# Altium footprint library PcbLib_ICs.PcbLib: 317 footprints (part 8 of 24) (continued)
## KT-28A-2.02 [mm]
pads (5):
  oval 2x4 hole 1.3 mask+0.075: 1(-2.54,-16.9) 2(0,-16.9) 3(2.54,-16.9)
  round 0 hole 4.2 unplated: 2(-0.001,4.35)
  rrect20% 11.8x15.15 smd paste-10 mask+0.05: 2(0,0.05)
Top Overlay:
  region: -4.1,-16.9 -5.4,-16.2 -5.4,-17.6
  lines w0.2: -5.6,-7.6 -5.6,-12.1 ccw(c-5.4,-12.1) -5.4,-12.3 5.4,-12.3 ccw(c5.4,-12.1) 5.6,-12.1 5.6,-7.6 ; -2.84,-12.3 -2.84,-14.5 -2.24,-14.5 -2.24,-12.3 ; -0.3,-12.3 -0.3,-14.5 0.3,-14.5 0.3,-12.3 ; 2.24,-12.3 2.24,-14.5 2.84,-14.5 2.84,-12.3
Top Paste:
  region: 1.25,1.25 0.25,1.25 0.25,0.25 1.25,0.25
  region: 1.25,-0.25 0.25,-0.25 0.25,-1.25 1.25,-1.25
  region: 2.75,-0.25 1.75,-0.25 1.75,-1.25 2.75,-1.25
  region: 2.75,1.25 1.75,1.25 1.75,0.25 2.75,0.25
  region: 4.25,-0.25 3.25,-0.25 3.25,-1.25 4.25,-1.25
  region: 4.25,1.25 3.25,1.25 3.25,0.25 4.25,0.25
  region: 5.75,-0.25 4.75,-0.25 4.75,-1.25 5.75,-1.25
  region: 5.75,1.25 4.75,1.25 4.75,0.25 5.75,0.25
  region: 5.75,-1.75 4.75,-1.75 4.75,-2.75 5.75,-2.75
  region: 4.25,-1.75 3.25,-1.75 3.25,-2.75 4.25,-2.75
  region: 2.75,-1.75 1.75,-1.75 1.75,-2.75 2.75,-2.75
  region: 1.25,-1.75 0.25,-1.75 0.25,-2.75 1.25,-2.75
  region: 5.75,-3.25 4.75,-3.25 4.75,-4.25 5.75,-4.25
  region: 4.25,-3.25 3.25,-3.25 3.25,-4.25 4.25,-4.25
  region: 2.75,-3.25 1.75,-3.25 1.75,-4.25 2.75,-4.25
  region: 1.25,-3.25 0.25,-3.25 0.25,-4.25 1.25,-4.25
  region: 2.75,2.75 1.75,2.75 1.75,1.75 2.75,1.75
  region: 4.25,2.75 3.25,2.75 3.25,1.75 4.25,1.75
  region: 5.75,2.75 4.75,2.75 4.75,1.75 5.75,1.75
  region: 5.75,4.25 4.75,4.25 4.75,3.25 5.75,3.25
  region: 4.25,4.25 3.25,4.25 3.25,3.25 4.25,3.25
  rectangle: -4.25,3.25 -3.25,4.25
  rectangle: -5.75,3.25 -4.75,4.25
  rectangle: -5.75,1.75 -4.75,2.75
  rectangle: -4.25,1.75 -3.25,2.75
  rectangle: -2.75,1.75 -1.75,2.75
  rectangle: -1.25,-4.25 -0.25,-3.25
  rectangle: -2.75,-4.25 -1.75,-3.25
  rectangle: -4.25,-4.25 -3.25,-3.25
  rectangle: -5.75,-4.25 -4.75,-3.25
  rectangle: -1.25,-2.75 -0.25,-1.75
  rectangle: -2.75,-2.75 -1.75,-1.75
  rectangle: -4.25,-2.75 -3.25,-1.75
  rectangle: -5.75,-2.75 -4.75,-1.75
  rectangle: -5.75,0.25 -4.75,1.25
  rectangle: -5.75,-1.25 -4.75,-0.25
  rectangle: -4.25,0.25 -3.25,1.25
  rectangle: -4.25,-1.25 -3.25,-0.25
  rectangle: -2.75,0.25 -1.75,1.25
  rectangle: -2.75,-1.25 -1.75,-0.25
  rectangle: -1.25,-1.25 -0.25,-0.25
  rectangle: -1.25,0.25 -0.25,1.25
  rectangle: -4.25,4.75 -3.25,5.75
  rectangle: -5.75,4.75 -4.75,5.75
  rectangle: -4.25,6.25 -3.25,7.25
  rectangle: -2.75,6.25 -1.75,7.25
  region: 2.75,7.25 1.75,7.25 1.75,6.25 2.75,6.25
  region: 4.25,7.25 3.25,7.25 3.25,6.25 4.25,6.25
  region: 5.75,5.75 4.75,5.75 4.75,4.75 5.75,4.75
  region: 4.25,5.75 3.25,5.75 3.25,4.75 4.25,4.75
  rectangle: -5.75,-5.75 -4.75,-4.75
  rectangle: -4.25,-5.75 -3.25,-4.75
  rectangle: -2.75,-5.75 -1.75,-4.75
  rectangle: -1.25,-5.75 -0.25,-4.75
  rectangle: -4.25,-7.25 -3.25,-6.25
  rectangle: -2.75,-7.25 -1.75,-6.25
  rectangle: -1.25,-7.25 -0.25,-6.25
  region: 1.25,-6.25 0.25,-6.25 0.25,-7.25 1.25,-7.25
  region: 2.75,-6.25 1.75,-6.25 1.75,-7.25 2.75,-7.25
  region: 4.25,-6.25 3.25,-6.25 3.25,-7.25 4.25,-7.25
  region: 1.25,-4.75 0.25,-4.75 0.25,-5.75 1.25,-5.75
  region: 2.75,-4.75 1.75,-4.75 1.75,-5.75 2.75,-5.75
  region: 4.25,-4.75 3.25,-4.75 3.25,-5.75 4.25,-5.75
  region: 5.75,-4.75 4.75,-4.75 4.75,-5.75 5.75,-5.75
Top Assy:
  circle w0.05: c-0.001,4.35 r1.8
  lines w0.05: -3.291,-11.95 -3.291,-12.8 -2.966,-12.8 -2.966,-15.725 ; -1.791,-11.95 -1.791,-12.8 -2.116,-12.8 -2.116,-15.725 ; -0.426,-11.95 -0.426,-15.725 ; 0.424,-11.95 0.424,-15.725 ; 1.789,-11.95 1.789,-12.8 2.114,-12.8 2.114,-15.725 ; 3.289,-11.95 3.289,-12.8 2.964,-12.8 2.964,-15.725 ; 5.399,-7.15 5.4,-7.15 5.4,1.15 5.399,1.15 ; -5.402,-7.15 -5.401,-7.15 ; -5.402,-7.15 -5.402,1.15 ; -5.402,1.15 -5.401,1.15 ; -5.401,1.15 -5.401,6.15 cw(c-4.401,6.15) -4.401,7.15 4.399,7.15 cw(c4.399,6.15) 5.399,6.15 5.399,1.15 ; -5.401,1.15 -5.401,-11.95 5.399,-11.95 5.399,1.15 ; -5.401,1.15 5.399,1.15 ; -5.301,-11.3 ccw(c-4.801,-11.3) -4.801,-11.8 ; -5.301,-11.3 -5.301,0.5 ; -5.301,-11.3 -5.211,-11.3 ; -5.301,0.5 cw(c-4.801,0.5) -4.801,1 ; -5.301,0.5 -5.211,0.5 ; -5.211,-11.3 ccw(c-4.801,-11.3) -4.801,-11.71 ; -5.211,-11.3 -5.211,0.5 ; -5.211,0.5 cw(c-4.801,0.5) -4.801,0.911 ; -4.801,-11.8 -4.801,-11.71 ; -4.801,-11.8 4.799,-11.8 ; -4.801,-11.71 4.799,-11.71 ; -4.801,0.911 4.799,0.911 ; -4.801,0.911 -4.801,1 ; -4.801,1 4.799,1 ; -4.001,-9.5 ccw(c-3.501,-9.5) -3.501,-10 ; -4.001,-9.5 -4.001,-1 ; -4.001,-9.5 -3.871,-9.5 ; -4.001,-1 cw(c-3.501,-1) -3.501,-0.5 ; -4.001,-1 -3.871,-1 ; -3.871,-9.5 ccw(c-3.501,-9.5) -3.501,-9.87 ; -3.871,-9.5 -3.871,-1 ; -3.871,-1 cw(c-3.501,-1) -3.501,-0.63 ; -3.501,-10 -3.501,-9.87 ; -3.501,-10 3.499,-10 ; -3.501,-9.87 3.499,-9.87 ; -3.501,-0.63 -3.501,-0.5 ; -3.501,-0.63 3.499,-0.63 ; -3.501,-0.5 3.499,-0.5 ; -2.966,-15.725 -2.966,-17.225 -2.116,-17.225 -2.116,-15.725 ; -2.966,-15.725 -2.116,-15.725 ; -0.426,-15.725 -0.426,-17.225 0.424,-17.225 0.424,-15.725 ; -0.426,-15.725 0.424,-15.725 ; 2.114,-15.725 2.114,-17.225 2.964,-17.225 2.964,-15.725 ; 2.114,-15.725 2.964,-15.725 ; 3.499,-10 ccw(c3.499,-9.5) 3.999,-9.5 ; 3.499,-10 3.499,-9.87 ; 3.499,-9.87 ccw(c3.499,-9.5) 3.869,-9.5 ; 3.499,-0.63 cw(c3.499,-1) 3.869,-1 ; 3.499,-0.63 3.499,-0.5 ; 3.499,-0.5 cw(c3.499,-1) 3.999,-1 ; 3.869,-9.5 3.999,-9.5 ; 3.869,-9.5 3.869,-1 ; 3.869,-1 3.999,-1 ; 3.999,-9.5 3.999,-1 ; 4.799,-11.8 ccw(c4.799,-11.3) 5.299,-11.3 ; 4.799,-11.8 4.799,-11.71 ; 4.799,-11.71 ccw(c4.799,-11.3) 5.21,-11.3 ; 4.799,0.911 cw(c4.799,0.5) 5.21,0.5 ; 4.799,0.911 4.799,1 ; 4.799,1 cw(c4.799,0.5) 5.299,0.5 ; 5.21,-11.3 5.21,0.5 ; 5.21,-11.3 5.299,-11.3 ; 5.21,0.5 5.299,0.5 ; 5.299,-11.3 5.299,0.5
  text ".Designator" at -3.443,-6.967 h2
Top Text:
  lines w0.1: -0.5,-6 0.5,-6 ; 0,-6.5 0,-5.5
3D body "KT-28A-2_02-1.x_t": height 4.4, standoff -4.75, extent -5.401,-17.225 5.401,7.15

## KT-46 [mm]
height 1.45
pads (3):
  rect 1.1x0.6 smd paste+0 mask+0.05: 1(-1.2,0.95)
  oval 1.1x0.6 smd paste+0 mask+0.05: 2(-1.2,-0.95) 3(1.2,0)
Top Overlay:
  circle w0.25: c-1.575,1.75 r0.125
  lines w0.2: -1,-1.5 -1,-1.625 1,-1.625 1,-1.5 ; -1,1.525 -1,1.65 1,1.65 1,1.525
Top Assy:
  circle w0.05: c-0.26,1.06 r0.169
  lines w0.05: -1.19,-1.19 -1.19,-0.71 ; -1.19,-1.19 -1.4,-1.19 -1.4,-0.71 -1.19,-0.71 ; -1.19,-1.19 -1.099,-1.19 ; -1.19,-0.71 -1.099,-0.71 ; -1.19,0.71 -1.19,1.19 ; -1.19,0.71 -1.4,0.71 -1.4,1.19 -1.19,1.19 ; -1.19,0.71 -1.099,0.71 ; -1.19,1.19 -1.099,1.19 ; -1.099,-1.19 -1.099,-0.71 ; -1.099,-1.19 -1.074,-1.19 ; -1.099,-0.71 -1.074,-0.71 ; -1.099,0.71 -1.099,1.19 ; -1.099,0.71 -1.074,0.71 ; -1.099,1.19 -1.074,1.19 ; -1.074,-1.19 -1.074,-0.71 ; -1.074,-1.19 -0.825,-1.19 ; -1.074,-0.71 -0.825,-0.71 ; -1.074,0.71 -1.074,1.19 ; -1.074,0.71 -0.825,0.71 ; -1.074,1.19 -0.825,1.19 ; -0.825,-1.19 -0.825,-0.71 ; -0.825,-1.19 -0.65,-1.19 ; -0.825,-0.71 -0.65,-0.71 ; -0.825,0.71 -0.825,1.19 ; -0.825,0.71 -0.65,0.71 ; -0.825,1.19 -0.65,1.19 ; -0.65,-1.45 0.65,-1.45 ; -0.65,-1.45 -0.65,-1.19 ; -0.65,-1.45 -0.576,-1.376 ; -0.65,-1.19 -0.65,-0.71 ; -0.65,-0.71 -0.65,0.71 ; -0.65,0.71 -0.65,1.19 ; -0.65,1.19 -0.65,1.45 ; -0.65,1.45 -0.576,1.376 ; -0.65,1.45 0.65,1.45 ; -0.576,-1.376 0.576,-1.376 ; -0.576,-1.376 -0.576,1.376 ; -0.576,1.376 0.576,1.376 ; 0.576,-1.376 0.65,-1.45 ; 0.576,-1.376 0.576,1.376 ; 0.576,1.376 0.65,1.45 ; 0.65,-1.45 0.65,-0.24 ; 0.65,-0.24 0.825,-0.24 ; 0.65,-0.24 0.65,0.24 ; 0.65,0.24 0.825,0.24 ; 0.65,0.24 0.65,1.45 ; 0.825,-0.24 0.825,0.24 ; 0.825,-0.24 1.074,-0.24 ; 0.825,0.24 1.074,0.24 ; 1.074,-0.24 1.074,0.24 ; 1.074,-0.24 1.099,-0.24 ; 1.074,0.24 1.099,0.24 ; 1.099,-0.24 1.099,0.24 ; 1.099,-0.24 1.19,-0.24 ; 1.099,0.24 1.19,0.24 ; 1.19,-0.24 1.19,0.24 ; 1.19,-0.24 1.4,-0.24 1.4,0.24 1.19,0.24
  text ".Designator" at 0.233,-1.719 h1
Top Text:
  lines w0.05: -2,-1.75 2,-1.75 2,1.75 -2,1.75 -2,-1.75
  lines w0.1: -0.5,0 0.5,0 ; 0,-0.5 0,0.5
3D body "SOT23-3.stp": height 1, standoff 0, extent -1.15,-1.45 1.15,1.45

## KT-93-1 [mm]
pads (3):
  rect 8x6.5 smd paste-10 mask+0.05: 1(0,0)
  rect 3x3.5 smd paste-10 mask+0.05: 2(2,-5.75) 3(-2,-5.75)
Top Overlay:
  lines w0.2: -4,-3.5 -4,-7.75 4,-7.75 4,-3.5 ; -4,3.5 4,3.5
Top Paste:
  drawing of 162 lines, arcs and shapes, not listed
Top Assy:
  lines w0.05: -3.736,-7.122 3.75,-7.122 3.75,2.925 -3.736,2.925 -3.736,-7.122 ; -3.441,-6.629 ccw(c-3.244,-6.629) -3.244,-6.826 3.257,-6.826 ccw(c3.257,-6.629) 3.454,-6.629 3.454,2.432 ccw(c3.257,2.432) 3.257,2.629 -3.244,2.629 ccw(c-3.244,2.432) -3.441,2.432 -3.441,-6.629 ; -2.751,-5.94 ccw(c-2.554,-5.94) -2.554,-6.137 2.568,-6.137 ccw(c2.568,-5.94) 2.765,-5.94 2.765,1.743 ccw(c2.568,1.743) 2.568,1.94 -2.554,1.94 ccw(c-2.554,1.743) -2.751,1.743 -2.751,-5.94 ; -2.603,-5.842 ccw(c-2.455,-5.841) -2.455,-5.989 2.469,-5.989 ccw(c2.469,-5.841) 2.617,-5.841 2.617,1.645 ccw(c2.469,1.645) 2.469,1.792 -2.455,1.792 ccw(c-2.455,1.644) -2.603,1.644 -2.603,-5.841
  text ".Designator" at -3.443,-2.967 h2
3D body "KT-93-1_PINK.x_t": height 2.98, standoff -0.02, extent -3.75,-7.3 3.75,2.8

## LBGA-24 [mm] "LBGA-24 package with 1mm pitch for EPCQL1024F24IN device"
height 1.3
pads (24):
  round 0.35 smd paste+0 mask+0.08: A2(-1,2) A3(0,2) A4(1,2) A5(2,2) B1(-2,1) B2(-1,1) B3(0,1) B4(1,1) B5(2,1) C1(-2,0) C2(-1,0) C3(0,0) C4(1,0) C5(2,0) D1(-2,-1) D2(-1,-1) D3(0,-1) D4(1,-1) D5(2,-1) E1(-2,-2) E2(-1,-2) E3(0,-2) E4(1,-2) E5(2,-2)
Top Overlay:
  circle w0.25: c-3.65,3.85 r0.125
  region: -2,4 -3,3 -3,4
  lines w0.2: -3,3 -2,4 ; -3,-4 -3,4 3,4 3,-4 -3,-4
Top Assy:
  circle w0.05: c-2,3 r0.15
  lines w0.05: -3,-4 -3,4 3,4 3,-4 -3,-4
  text ".Designator" at -3.443,-0.467 h2
Top Text:
  lines w0.05: -3.25,-4.25 -3.25,4.25 3.25,4.25 3.25,-4.25 -3.25,-4.25
  lines w0.1: -0.5,0 0.5,0 ; 0,-0.5 0,0.5
3D body "LBGA-24.step": height 1.3, standoff 0, extent -3,-4 3,4

## LCC-12 (E-12-4) [mm] "Case style E-12-4"
height 0.8
pads (13):
  rect 0.7x0.32 smd paste+0 mask+0.05: 1(-1.4,0.5)
  oval 0.7x0.32 smd paste+0 mask+0.05: 2(-1.4,0) 3(-1.4,-0.5) 7(1.4,-0.5) 8(1.4,0) 9(1.4,0.5)
  oval 0.32x0.7 smd paste+0 mask+0.05: 4(-0.5,-1.4) 5(0,-1.4) 6(0.5,-1.4) 10(0.5,1.4) 11(0,1.4) 12(-0.5,1.4)
  rrect8% 1.6x1.6 smd paste-5 mask+0.05: EP(0,0)
via -0.375,0.375 diameter 0.7 hole 0.3
via 0.375,-0.375 diameter 0.7 hole 0.3
via 0.375,0.375 diameter 0.7 hole 0.3
via -0.375,-0.375 diameter 0.7 hole 0.3
Top Overlay:
  circle w0.25: c-2.35,1.55 r0.125
  lines w0.2: -1.7,-1.2 -1.7,-1.7 -1.2,-1.7 ; -1.7,1.2 -1.7,1.7 -1.2,1.7 ; 1.2,-1.7 1.7,-1.7 1.7,-1.2 ; 1.2,1.7 1.7,1.7 1.7,1.2
Top Paste:
  rectangle: -0.7,0.1 -0.1,0.7
  rectangle: 0.1,-0.7 0.7,-0.1
  rectangle: -0.7,-0.7 -0.1,-0.1
  region: 0.7,0.7 0.1,0.7 0.1,0.1 0.7,0.1
Bottom Solder:
  region: -0.9,0.9 -0.15,0.9 0,0.75 0.15,0.9 0.9,0.9 0.9,0.15 0.75,0 0.9,-0.151 0.9,-0.9 0.149,-0.9 0,-0.75 -0.15,-0.9 -0.9,-0.9 -0.9,-0.15 -0.75,0 -0.9,0.15
Top Assy:
  circle w0.05: c-1,1 r0.2
  lines w0.05: -1.45,-0.625 -1.5,-0.625 -1.5,-0.375 -1.45,-0.375 ; -1.45,-0.125 -1.5,-0.125 -1.5,0.125 -1.45,0.125 ; -1.45,0.375 -1.5,0.375 -1.5,0.625 -1.45,0.625 ; -0.625,-1.45 -0.625,-1.5 -0.375,-1.5 -0.375,-1.45 ; -0.625,1.45 -0.625,1.5 -0.375,1.5 -0.375,1.45 ; -0.125,-1.45 -0.125,-1.5 0.125,-1.5 0.125,-1.45 ; -0.125,1.45 -0.125,1.5 0.125,1.5 0.125,1.45 ; 0.375,-1.45 0.375,-1.5 0.625,-1.5 0.625,-1.45 ; 0.375,1.45 0.375,1.5 0.625,1.5 0.625,1.45 ; 1.45,-0.625 1.5,-0.625 1.5,-0.375 1.45,-0.375 ; 1.45,-0.125 1.5,-0.125 1.5,0.125 1.45,0.125 ; 1.45,0.375 1.5,0.375 1.5,0.625 1.45,0.625 ; -1.45,-1.45 -1.45,1.45 1.45,1.45 1.45,-1.45 -1.45,-1.45
  text ".Designator" at -3.443,-0.467 h2
Top Text:
  lines w0.05: -1.85,-1.85 -1.85,1.85 1.85,1.85 1.85,-1.85 -1.85,-1.85
  lines w0.1: -0.5,0 0.5,0 ; 0,-0.5 0,0.5
3D body "LCC12_E12_4.STEP": height 0.8, standoff -0.03, extent -1.45,-1.45 1.45,1.45

## LCC-24 (E-24-1) [mm] "Case style E-24-1"
height 0.8
pads (25):
  rect 0.7x0.32 smd paste+0 mask+0.05: 1(-1.9,1.25)
  oval 0.7x0.32 smd paste+0 mask+0.05: 2(-1.9,0.75) 3(-1.9,0.25) 4(-1.9,-0.25) 5(-1.9,-0.75) 6(-1.9,-1.25) 13(1.9,-1.25) 14(1.9,-0.75) 15(1.9,-0.25) 16(1.9,0.25) 17(1.9,0.75) 18(1.9,1.25)
  oval 0.32x0.7 smd paste+0 mask+0.05: 7(-1.25,-1.9) 8(-0.75,-1.9) 9(-0.25,-1.9) 10(0.25,-1.9) 11(0.75,-1.9) 12(1.25,-1.9) 19(1.25,1.9) 20(0.75,1.9) 21(0.25,1.9) 22(-0.25,1.9) 23(-0.75,1.9) 24(-1.25,1.9)
  rrect8% 2.6x2.6 smd paste-5 mask+0.05: EP(0,0)
via -0.75,0.75 diameter 0.7 hole 0.3
via 0.75,0.75 diameter 0.7 hole 0.3
via 0.75,-0.75 diameter 0.7 hole 0.3
via -0.75,-0.75 diameter 0.7 hole 0.3
via 0,0 diameter 0.7 hole 0.3
via 0,0.75 diameter 0.7 hole 0.3
via 0.75,0 diameter 0.7 hole 0.3
via -0.75,0 diameter 0.7 hole 0.3
via 0,-0.75 diameter 0.7 hole 0.3
Top Overlay:
  circle w0.25: c-2.85,2.05 r0.125
  lines w0.2: -2.2,-1.7 -2.2,-2.2 -1.7,-2.2 ; -2.2,1.7 -2.2,2.2 -1.7,2.2 ; 1.7,-2.2 2.2,-2.2 2.2,-1.7 ; 1.7,2.2 2.2,2.2 2.2,1.7
Top Paste:
  rectangle: 0.5,-1.1 1.1,-0.5
  rectangle: -0.3,-1.1 0.3,-0.5
  rectangle: -1.1,-1.1 -0.5,-0.5
  rectangle: 0.5,0.5 1.1,1.1
  rectangle: 0.5,-0.3 1.1,0.3
  rectangle: -1.1,0.5 -0.5,1.1
  rectangle: -0.3,-0.3 0.3,0.3
  rectangle: -1.1,-0.3 -0.5,0.3
  region: 0.3,1.1 -0.3,1.1 -0.3,0.5 0.3,0.5
Bottom Solder:
  region: -1.5,1.5 -0.3,1.5 0,1.2 0.3,1.5 1.5,1.5 1.5,0.3 1.2,0 1.5,-0.3 1.5,-1.5 0.3,-1.5 0,-1.2 -0.3,-1.5 -1.5,-1.5 -1.5,-0.3 -1.2,0 -1.5,0.3
Top Assy:
  circle w0.05: c-1.5,1.5 r0.25
  lines w0.05: -1.95,-1.375 -2,-1.375 -2,-1.125 -1.95,-1.125 ; -1.95,-0.875 -2,-0.875 -2,-0.625 -1.95,-0.625 ; -1.95,-0.375 -2,-0.375 -2,-0.125 -1.95,-0.125 ; -1.95,0.125 -2,0.125 -2,0.375 -1.95,0.375 ; -1.95,0.625 -2,0.625 -2,0.875 -1.95,0.875 ; -1.95,1.125 -2,1.125 -2,1.375 -1.95,1.375 ; -1.375,-1.95 -1.375,-2 -1.125,-2 -1.125,-1.95 ; -1.375,1.95 -1.375,2 -1.125,2 -1.125,1.95 ; -0.875,-1.95 -0.875,-2 -0.625,-2 -0.625,-1.95 ; -0.875,1.95 -0.875,2 -0.625,2 -0.625,1.95 ; -0.375,-1.95 -0.375,-2 -0.125,-2 -0.125,-1.95 ; -0.375,1.95 -0.375,2 -0.125,2 -0.125,1.95 ; 0.125,-1.95 0.125,-2 0.375,-2 0.375,-1.95 ; 0.125,1.95 0.125,2 0.375,2 0.375,1.95 ; 0.625,-1.95 0.625,-2 0.875,-2 0.875,-1.95 ; 0.625,1.95 0.625,2 0.875,2 0.875,1.95 ; 1.125,-1.95 1.125,-2 1.375,-2 1.375,-1.95 ; 1.125,1.95 1.125,2 1.375,2 1.375,1.95 ; 1.95,-1.375 2,-1.375 2,-1.125 1.95,-1.125 ; 1.95,-0.875 2,-0.875 2,-0.625 1.95,-0.625 ; 1.95,-0.375 2,-0.375 2,-0.125 1.95,-0.125 ; 1.95,0.125 2,0.125 2,0.375 1.95,0.375 ; 1.95,0.625 2,0.625 2,0.875 1.95,0.875 ; 1.95,1.125 2,1.125 2,1.375 1.95,1.375 ; -1.95,-1.95 1.95,-1.95 1.95,1.95 -1.95,1.95 -1.95,-1.95
  text ".Designator" at -3.443,-0.467 h2
Top Text:
  lines w0.05: -2.6,-2.6 -2.6,2.6 2.6,2.6 2.6,-2.6 -2.6,-2.6
  lines w0.1: -0.5,0 0.5,0 ; 0,-0.5 0,0.5
3D body "LCC24_E24_1.STEP": height 1, standoff -0.03, extent -1.95,-1.95 1.95,1.95

## LFCSP-8 [mm]
height 0.6
pads (8):
  rect 0.7x0.3 smd paste+0 mask+0.05: 1(-1.35,0.75)
  oval 0.7x0.3 smd paste+0 mask+0.05: 2(-1.35,0.25) 3(-1.35,-0.25) 4(-1.35,-0.75) 5(1.35,-0.75) 6(1.35,-0.25) 7(1.35,0.25) 8(1.35,0.75)
Top Overlay:
  circle w0.25: c-2.375,1.55 r0.125
  lines w0.2: -1.75,1.125 -1.15,1.725 -0.9,1.725 1.05,1.725 1.65,1.125 ; -1.7,-1.1 -1.1,-1.7 0.85,-1.7 1.1,-1.7 1.7,-1.1
Bottom Simple Assy:
  rectangle: 1.15,0.65 1.55,0.85
  rectangle: 1.15,0.15 1.55,0.35
  rectangle: 1.15,-0.35 1.55,-0.15
  rectangle: 1.15,-0.85 1.55,-0.65
  rectangle: -1.55,-0.85 -1.15,-0.65
  rectangle: -1.55,-0.35 -1.15,-0.15
  rectangle: -1.55,0.15 -1.15,0.35
  rectangle: -1.55,0.65 -1.15,0.85
Top Assy:
  circle w0.05: c-0.751,0.75 r0.15
  lines w0.05: -1.501,-0.865 -1.501,-0.95 -0.951,-1.5 0.949,-1.5 1.499,-0.95 1.499,-0.865 ; -1.501,-0.635 -1.501,-0.365 ; -1.501,-0.135 -1.501,0.135 ; -1.501,0.365 -1.501,0.635 ; -1.501,0.865 -1.501,0.95 -0.951,1.5 0.949,1.5 1.499,0.95 1.499,0.865 ; -1.376,-0.865 -1.376,-0.898 ; -1.376,-0.635 -1.376,-0.365 ; -1.376,-0.135 -1.376,0.135 ; -1.376,0.365 -1.376,0.635 ; -1.376,0.865 -1.376,0.898 ; 1.374,-0.865 1.374,-0.898 ; 1.374,-0.635 1.374,-0.365 ; 1.374,-0.135 1.374,0.135 ; 1.374,0.365 1.374,0.635 ; 1.374,0.865 1.374,0.898 ; 1.499,-0.635 1.499,-0.365 ; 1.499,-0.135 1.499,0.135 ; 1.499,0.365 1.499,0.635 ; -1.376,-0.898 -1.24,-0.842 ; -1.376,-0.898 -0.899,-1.375 ; -1.376,0.898 -1.24,0.842 ; -1.376,0.898 -0.899,1.375 ; -1.24,-0.842 -1.24,0.842 ; -1.24,-0.842 -0.843,-1.239 ; -1.24,0.842 -0.843,1.239 ; -0.899,-1.375 -0.751,-1.375 ; -0.899,-1.375 -0.843,-1.239 ; -0.899,1.375 -0.843,1.239 ; -0.899,1.375 -0.751,1.375 ; -0.843,-1.239 0.841,-1.239 ; -0.843,1.239 0.841,1.239 ; -0.751,-1.49 -0.631,-1.49 ; -0.751,-1.49 -0.749,-1.488 ; -0.751,-1.49 -0.751,-1.375 ; -0.751,-1.375 -0.749,-1.373 ; -0.751,1.375 -0.749,1.373 ; -0.751,1.375 -0.751,1.49 ; -0.751,1.49 -0.749,1.488 ; -0.751,1.49 -0.631,1.49 ; -0.749,-1.488 -0.633,-1.488 ; -0.749,-1.488 -0.749,-1.373 ; -0.749,-1.373 -0.633,-1.373 ; -0.749,1.373 -0.633,1.373 ; -0.749,1.373 -0.749,1.488 ; -0.749,1.488 -0.633,1.488 ; -0.633,-1.488 -0.633,-1.373 ; -0.633,-1.488 -0.631,-1.49 ; -0.633,-1.373 -0.631,-1.375 ; -0.633,1.373 -0.631,1.375 ; -0.633,1.373 -0.633,1.488 ; -0.633,1.488 -0.631,1.49 ; -0.631,-1.49 -0.631,-1.375 ; -0.631,-1.375 0.629,-1.375 ; -0.631,1.375 0.629,1.375 ; -0.631,1.375 -0.631,1.49 ; 0.629,-1.49 0.749,-1.49 ; 0.629,-1.49 0.631,-1.488 ; 0.629,-1.49 0.629,-1.375 ; 0.629,-1.375 0.631,-1.373 ; 0.629,1.375 0.631,1.373 ; 0.629,1.375 0.629,1.49 ; 0.629,1.49 0.631,1.488 ; 0.629,1.49 0.749,1.49 ; 0.631,-1.488 0.631,-1.373 ; 0.631,-1.488 0.747,-1.488 ; 0.631,-1.373 0.747,-1.373 ; 0.631,1.373 0.747,1.373 ; 0.631,1.373 0.631,1.488 ; 0.631,1.488 0.747,1.488 ; 0.747,-1.488 0.747,-1.373 ; 0.747,-1.488 0.749,-1.49 ; 0.747,-1.373 0.749,-1.375 ; 0.747,1.373 0.749,1.375 ; 0.747,1.373 0.747,1.488 ; 0.747,1.488 0.749,1.49 ; 0.749,-1.49 0.749,-1.375 ; 0.749,-1.375 0.897,-1.375 ; 0.749,1.375 0.897,1.375 ; 0.749,1.375 0.749,1.49 ; 0.841,-1.239 1.238,-0.842 ; 0.841,-1.239 0.897,-1.375 ; 0.841,1.239 1.238,0.842 ; 0.841,1.239 0.897,1.375 ; 0.897,-1.375 1.374,-0.898 ; 0.897,1.375 1.374,0.898 ; 1.238,-0.842 1.238,0.842 ; 1.238,-0.842 1.374,-0.898 ; 1.238,0.842 1.374,0.898 ; -1.511,-0.865 -1.374,-0.865 -1.374,-0.635 -1.511,-0.635 -1.511,-0.865 ; -1.511,-0.365 -1.374,-0.365 -1.374,-0.135 -1.511,-0.135 -1.511,-0.365 ; -1.511,0.135 -1.374,0.135 -1.374,0.365 -1.511,0.365 -1.511,0.135 ; -1.511,0.635 -1.374,0.635 -1.374,0.865 -1.511,0.865 -1.511,0.635 ; 1.372,-0.865 1.372,-0.635 1.509,-0.635 1.509,-0.865 1.372,-0.865 ; 1.372,-0.365 1.372,-0.135 1.509,-0.135 1.509,-0.365 1.372,-0.365 ; 1.372,0.135 1.372,0.365 1.509,0.365 1.509,0.135 1.372,0.135 ; 1.372,0.635 1.372,0.865 1.509,0.865 1.509,0.635 1.372,0.635
  text ".Designator" at -2.58,-0.349 h1.5
Top Text:
  lines w0.1: -0.5,0 0.5,0 ; 0,-0.5 0,0.5
3D body "User Library-lfcsp-8.step": height 0.9, standoff -0.04, extent -1.501,-1.5 1.501,1.5

## LFCSP-8EP [mm]
pads (9):
  rect 0.5x0.25 smd paste+0 mask+0.08: 1(-1.6,0.75)
  oval 0.5x0.25 smd paste+0 mask+0.08: 2(-1.6,0.25) 3(-1.6,-0.25) 4(-1.6,-0.75) 5(1.6,-0.75) 6(1.6,-0.25) 7(1.6,0.25) 8(1.6,0.75)
  rect 1.6x2.34 smd paste-50 mask+0.08: EP(0,0)
via -0.4,0.8 diameter 0.7 hole 0.3
via 0.4,0.8 diameter 0.7 hole 0.3
via 0.4,0 diameter 0.7 hole 0.3
via -0.4,0 diameter 0.7 hole 0.3
via 0.4,-0.8 diameter 0.7 hole 0.3
via -0.4,-0.8 diameter 0.7 hole 0.3
Top Overlay:
  circle w0.25: c-2.35,1.55 r0.125
  lines w0.2: -1.7,-1.1 -1.1,-1.7 0.85,-1.7 1.1,-1.7 1.7,-1.1 ; -1.7,1.1 -1.1,1.7 -0.85,1.7 1.1,1.7 1.7,1.1
Top Paste:
  region: -0.1,-1.1 -0.1,-0.5 -0.7,-0.5 -0.7,-1.1
  region: 0.7,-1.1 0.7,-0.5 0.1,-0.5 0.1,-1.1
  region: -0.7,1.1 -0.7,0.5 -0.1,0.5 -0.1,1.1
  region: 0.1,1.1 0.1,0.5 0.7,0.5 0.7,1.1
  rectangle: 0.1,-0.3 0.7,0.3
  rectangle: -0.7,-0.3 -0.1,0.3
Bottom Solder:
  region: -1,1.3 1,1.3 1,0.3 0.7,0 1,-0.3 1,-1.3 0,-1.3 -1,-1.3 -1,-0.3 -0.7,0 -1,0.3
Top Assy:
  circle w0.05: c-0.75,0.75 r0.15
  lines w0.05: -1.5,-0.865 -1.5,-0.95 -0.95,-1.5 0.95,-1.5 1.5,-0.95 1.5,-0.865 ; -1.5,-0.635 -1.5,-0.365 ; -1.5,-0.135 -1.5,0.135 ; -1.5,0.365 -1.5,0.635 ; -1.5,0.865 -1.5,0.95 -0.95,1.5 0.95,1.5 1.5,0.95 1.5,0.865 ; -1.375,-0.865 -1.375,-0.898 ; -1.375,-0.635 -1.375,-0.365 ; -1.375,-0.135 -1.375,0.135 ; -1.375,0.365 -1.375,0.635 ; -1.375,0.865 -1.375,0.898 ; 1.375,-0.865 1.375,-0.898 ; 1.375,-0.635 1.375,-0.365 ; 1.375,-0.135 1.375,0.135 ; 1.375,0.365 1.375,0.635 ; 1.375,0.865 1.375,0.898 ; 1.5,-0.635 1.5,-0.365 ; 1.5,-0.135 1.5,0.135 ; 1.5,0.365 1.5,0.635 ; -1.375,-0.898 -0.898,-1.375 ; -1.375,-0.898 -1.239,-0.842 ; -1.375,0.898 -0.898,1.375 ; -1.375,0.898 -1.239,0.842 ; -1.239,-0.842 -0.842,-1.239 ; -1.239,-0.842 -1.239,0.842 ; -1.239,0.842 -0.842,1.239 ; -0.898,-1.375 -0.842,-1.239 ; -0.898,-1.375 -0.75,-1.375 ; -0.898,1.375 -0.75,1.375 ; -0.898,1.375 -0.842,1.239 ; -0.842,-1.239 0.842,-1.239 ; -0.842,1.239 0.842,1.239 ; -0.75,-1.49 -0.75,-1.375 ; -0.75,-1.49 -0.748,-1.488 ; -0.75,-1.49 -0.63,-1.49 ; -0.75,-1.375 -0.748,-1.373 ; -0.75,1.375 -0.75,1.49 ; -0.75,1.375 -0.748,1.373 ; -0.75,1.49 -0.63,1.49 ; -0.75,1.49 -0.748,1.488 ; -0.748,-1.488 -0.748,-1.373 ; -0.748,-1.488 -0.632,-1.488 ; -0.748,-1.373 -0.632,-1.373 ; -0.748,1.373 -0.748,1.488 ; -0.748,1.373 -0.632,1.373 ; -0.748,1.488 -0.632,1.488 ; -0.632,-1.488 -0.63,-1.49 ; -0.632,-1.488 -0.632,-1.373 ; -0.632,-1.373 -0.63,-1.375 ; -0.632,1.373 -0.632,1.488 ; -0.632,1.373 -0.63,1.375 ; -0.632,1.488 -0.63,1.49 ; -0.63,-1.49 -0.63,-1.375 ; -0.63,-1.375 0.63,-1.375 ; -0.63,1.375 -0.63,1.49 ; -0.63,1.375 0.63,1.375 ; 0.63,-1.49 0.63,-1.375 ; 0.63,-1.49 0.632,-1.488 ; 0.63,-1.49 0.75,-1.49 ; 0.63,-1.375 0.632,-1.373 ; 0.63,1.375 0.63,1.49 ; 0.63,1.375 0.632,1.373 ; 0.63,1.49 0.75,1.49 ; 0.63,1.49 0.632,1.488 ; 0.632,-1.488 0.748,-1.488 ; 0.632,-1.488 0.632,-1.373 ; 0.632,-1.373 0.748,-1.373 ; 0.632,1.373 0.632,1.488 ; 0.632,1.373 0.748,1.373 ; 0.632,1.488 0.748,1.488 ; 0.748,-1.488 0.75,-1.49 ; 0.748,-1.488 0.748,-1.373 ; 0.748,-1.373 0.75,-1.375 ; 0.748,1.373 0.748,1.488 ; 0.748,1.373 0.75,1.375 ; 0.748,1.488 0.75,1.49 ; 0.75,-1.49 0.75,-1.375 ; 0.75,-1.375 0.898,-1.375 ; 0.75,1.375 0.75,1.49 ; 0.75,1.375 0.898,1.375 ; 0.842,-1.239 0.898,-1.375 ; 0.842,-1.239 1.239,-0.842 ; 0.842,1.239 0.898,1.375 ; 0.842,1.239 1.239,0.842 ; 0.898,-1.375 1.375,-0.898 ; 0.898,1.375 1.375,0.898 ; 1.239,-0.842 1.375,-0.898 ; 1.239,-0.842 1.239,0.842 ; 1.239,0.842 1.375,0.898 ; -1.51,-0.865 -1.51,-0.635 -1.373,-0.635 -1.373,-0.865 -1.51,-0.865 ; -1.51,-0.365 -1.51,-0.135 -1.373,-0.135 -1.373,-0.365 -1.51,-0.365 ; -1.51,0.135 -1.51,0.365 -1.373,0.365 -1.373,0.135 -1.51,0.135 ; -1.51,0.635 -1.51,0.865 -1.373,0.865 -1.373,0.635 -1.51,0.635 ; 1.373,-0.865 1.51,-0.865 1.51,-0.635 1.373,-0.635 1.373,-0.865 ; 1.373,-0.365 1.51,-0.365 1.51,-0.135 1.373,-0.135 1.373,-0.365 ; 1.373,0.135 1.51,0.135 1.51,0.365 1.373,0.365 1.373,0.135 ; 1.373,0.635 1.51,0.635 1.51,0.865 1.373,0.865 1.373,0.635
  text ".Designator" at -2.579,-0.349 h1.5
Top Text:
  lines w0.05: -2.1,-2.1 2.1,-2.1 2.1,2.1 -2.1,2.1 -2.1,-2.1
  lines w0.1: -0.5,0 0.5,0 ; 0,-0.5 0,0.5
3D body "User Library-LFCSP-8-1.step": height 0.9, standoff 0, extent -1.51,-1.5 1.51,1.5

## LFCSP-10EP [mm]
height 0.8
pads (11):
  rect 0.75x0.3 smd paste+0 mask+0.05: 1(-1.4,1)
  rrect50% 0.75x0.3 smd paste+0 mask+0.05: 2(-1.4,0.5) 3(-1.4,0) 4(-1.4,-0.5) 5(-1.4,-1) 6(1.4,-1) 7(1.4,-0.5) 8(1.4,0) 9(1.4,0.5) 10(1.4,1)
  rrect10% 1.7x2.55 smd paste-10 mask+0.05: EP(0,0)
via 0.5,-0.9 diameter 0.7 hole 0.3
via -0.5,-0.9 diameter 0.7 hole 0.3
via -0.5,0.9 diameter 0.7 hole 0.3
via 0.5,0.9 diameter 0.7 hole 0.3
via 0,0 diameter 0.7 hole 0.3
Top Overlay:
  circle w0.25: c-2.3,1 r0.125
  lines w0.2: -1.7,-1.4 -1.7,-1.7 1.7,-1.7 1.7,-1.4 ; -1.7,1.4 -1.7,1.7 1.7,1.7 1.7,1.4
Top Paste:
  rectangle: -0.8,-0.35 -0.1,0.35
  region: 0.8,0.35 0.1,0.35 0.1,-0.35 0.8,-0.35
  rectangle: -0.8,0.55 -0.1,1.25
  region: 0.8,1.25 0.1,1.25 0.1,0.55 0.8,0.55
  region: 0.8,-0.55 0.1,-0.55 0.1,-1.25 0.8,-1.25
  rectangle: -0.8,-1.25 -0.1,-0.55
Bottom Solder:
  region: -1,1.4 -0.3,1.4 0,1.1 0.3,1.4 1,1.4 1,0.3 0.7,0 1,-0.3 1,-1.4 0.3,-1.4 0,-1.1 -0.3,-1.4 -1,-1.4 -1,-0.3 -0.7,0 -1,0.3
Top Assy:
  circle w0.05: c-1,1 r0.2
  lines w0.05: -1.5,-1.15 -1.6,-1.15 -1.6,-0.85 -1.5,-0.85 ; -1.5,-0.65 -1.6,-0.65 -1.6,-0.35 -1.5,-0.35 ; -1.5,-0.15 -1.6,-0.15 -1.6,0.15 -1.5,0.15 ; -1.5,0.35 -1.6,0.35 -1.6,0.65 -1.5,0.65 ; -1.5,0.85 -1.6,0.85 -1.6,1.15 -1.5,1.15 ; 1.5,-1.15 1.6,-1.15 1.6,-0.85 1.5,-0.85 ; 1.5,-0.65 1.6,-0.65 1.6,-0.35 1.5,-0.35 ; 1.5,-0.15 1.6,-0.15 1.6,0.15 1.5,0.15 ; 1.5,0.35 1.6,0.35 1.6,0.65 1.5,0.65 ; 1.5,0.85 1.6,0.85 1.6,1.15 1.5,1.15 ; -1.5,-1.5 1.5,-1.5 1.5,1.5 -1.5,1.5 -1.5,-1.5
  text ".Designator" at 0.349,-2.579 h1.5
Top Text:
  lines w0.05: -1.9,-1.6 1.9,-1.6 1.9,1.6 -1.9,1.6 -1.9,-1.6
  lines w0.1: -0.5,0 0.5,0 ; 0,-0.5 0,0.5
3D body "LFCSP_WD_10.SLDPRT": height 0.8, standoff 0, extent -1.52,-1.5 1.52,1.5